# Altium footprint library UP-ROBOT Devices(2013-02-26).PcbLib: 150 footprints (part 7 of 10)
Each footprint in its own frame and in the unit in brackets; x right, y up, seen from the top. Pads: shape width x height; smd on the part's side, far side on the other; paste and mask are expansions set on the pad; w line width, h text height; cw(c..) or ccw(c..) is an arc to the next point about the centre after c.
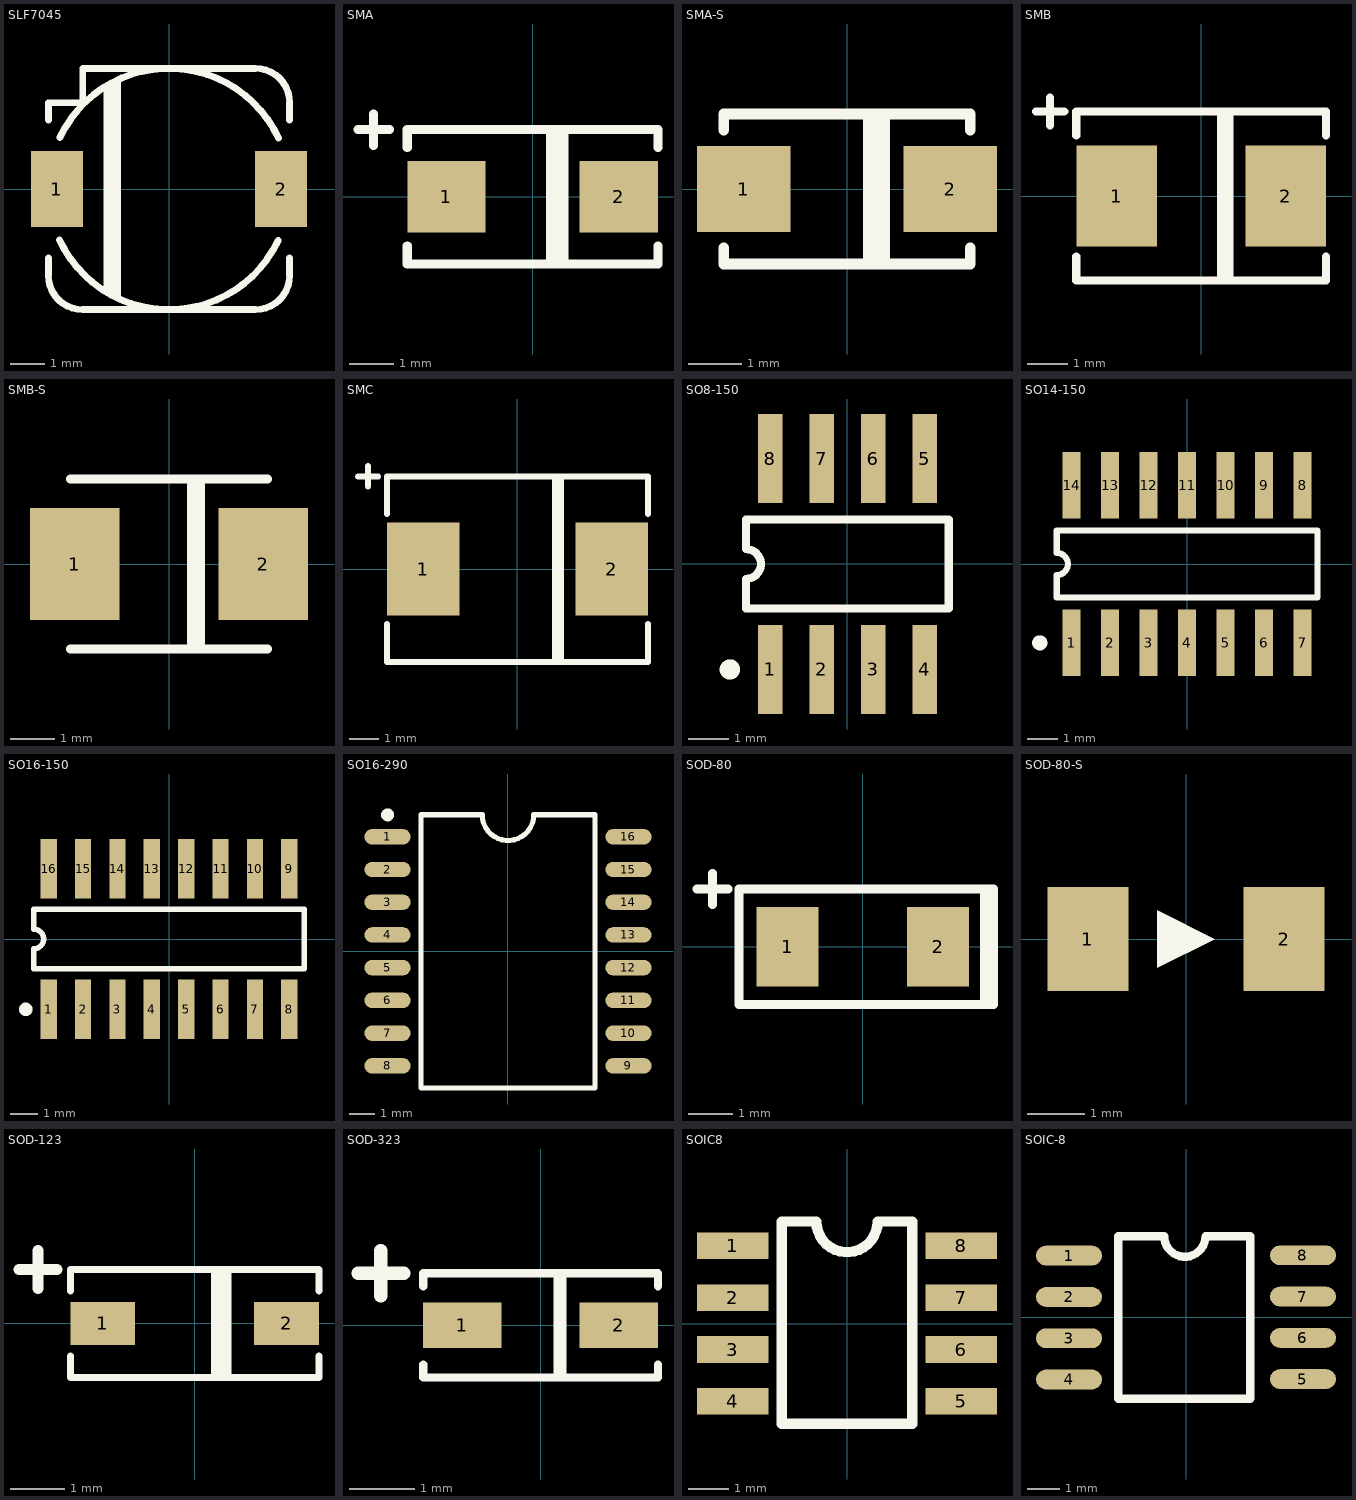
[diagram p6: the footprints below, top view; thin cyan lines are the x and y axes]

## SLF7045 [mm]
pads (2):
  rect 1.5x2.2 smd: 1(-3.25,0) 2(3.25,0)
Top Overlay:
  rectangle: -1.9,-3.03 -1.6,3.03
  rectangle: -1.69,-3.13 -1.39,3.13
  lines w0.2: -3.5,-2 -3.5,-2.5 ccw(c-2.5,-2.5) -2.5,-3.5 2.5,-3.5 ccw(c2.5,-2.5) 3.5,-2.5 3.5,-2 ; -3.5,2 -3.5,2.5 -2.5,2.5 -2.5,3.5 2.5,3.5 cw(c2.5,2.5) 3.5,2.5 3.5,2 ; -3.171,-1.482 ccw(c0,0) 3.167,-1.489 ; -3.167,1.489 cw(c0,0) 3.171,1.482
3D body: height 4.5, standoff 0, extent -3.6,-3.5 3.6,3.5

## SMA [mm]
pads (2):
  rect 1.75x1.6 smd: 1(-1.925,0) 2(1.925,0)
Top Overlay:
  rectangle: 0.3,-1.5 0.806,1.5
  lines w0.203: -3.9,1.5 -3.55,1.5 ; -3.55,1.15 -3.55,1.5 ; -3.55,1.85 -3.55,1.5 ; -3.2,1.5 -3.55,1.5 ; -2.8,-1.1 -2.8,-1.5 2.8,-1.5 2.8,-1.1 ; -2.8,1.1 -2.8,1.5 2.8,1.5 2.8,1.1

## SMA-S [mm]
pads (2):
  rect 1.75x1.6 smd: 1(-1.925,0) 2(1.925,0)
Top Overlay:
  rectangle: 0.3,-1.5 0.806,1.5
  lines w0.203: -2.3,-1.1 -2.3,-1.4 2.3,-1.4 2.3,-1.1 ; -2.3,1.1 -2.3,1.4 2.3,1.4 2.3,1.1
3D body: height 2.15, standoff 0, extent -2.6,-1.325 2.6,1.325

## SMB [mm]
pads (2):
  rect 2x2.5 smd: 1(-2.1,0) 2(2.1,0)
Top Overlay:
  rectangle: 0.4,-2.1 0.806,2.1
  lines w0.203: -4.1,2.1 -3.75,2.1 ; -3.75,1.75 -3.75,2.1 ; -3.75,2.45 -3.75,2.1 ; -3.4,2.1 -3.75,2.1 ; -3.1,-1.5 -3.1,-2.1 3.1,-2.1 3.1,-1.5 ; -3.1,1.5 -3.1,2.1 3.1,2.1 3.1,1.5
3D body: height 2.4, standoff 0, extent -2.794,-1.905 2.806,1.895

## SMB-S [mm]
pads (2):
  rect 2x2.5 smd: 1(-2.1,0) 2(2.1,0)
Top Overlay:
  rectangle: 0.4,-1.9 0.806,1.9
  lines w0.203: -2.2,-1.9 2.2,-1.9 ; -2.2,1.9 2.2,1.9
3D body: height 2.4, standoff 0, extent -2.794,-1.905 2.806,1.895

## SMC [mm]
pads (2):
  rect 2.5x3.2 smd: 1(-3.25,0) 2(3.25,0)
Top Overlay:
  rectangle: 1.2,-3.2 1.606,3.2
  lines w0.203: -5.5,3.2 -5.15,3.2 ; -5.15,2.85 -5.15,3.2 ; -5.15,3.55 -5.15,3.2 ; -4.8,3.2 -5.15,3.2 ; -4.5,-1.9 -4.5,-3.2 4.5,-3.2 4.5,-1.9 ; -4.5,1.9 -4.5,3.2 4.5,3.2 4.5,1.9
3D body: height 2.8, standoff 0, extent -3.799,-3.1 3.799,3.12

## SO8-150 [mm]
pads (8):
  rect 0.6x2.2 smd: 1(-1.905,-2.6) 2(-0.635,-2.6) 3(0.635,-2.6) 4(1.905,-2.6) 5(1.905,2.6) 6(0.635,2.6) 7(-0.635,2.6) 8(-1.905,2.6)
Top Overlay:
  circle w0.25: c-2.9,-2.6 r0.125
  lines w0.2: -2.5,-1.1 -2.5,-0.367 ccw(c-2.5,0) -2.5,0.367 -2.5,1.1 2.5,1.1 2.5,-1.1 -2.5,-1.1
3D body: height 1.4, standoff -0.05, extent -2.438,-2.972 2.464,2.972

## SO14-150 [mm]
pads (14):
  rect 0.6x2.2 smd: 1(-3.81,-2.6) 2(-2.54,-2.6) 3(-1.27,-2.6) 4(0,-2.6) 5(1.27,-2.6) 6(2.54,-2.6) 7(3.81,-2.6) 8(3.81,2.6) 9(2.54,2.6) 10(1.27,2.6) 11(0,2.6) 12(-1.27,2.6) 13(-2.54,2.6) 14(-3.81,2.6)
Top Overlay:
  circle w0.25: c-4.86,-2.6 r0.125
  lines w0.2: -4.3,-1.1 -4.3,-0.367 ccw(c-4.3,0) -4.3,0.367 -4.3,1.1 4.3,1.1 4.3,-1.1 -4.3,-1.1
3D body: height 1.75, standoff -0.01, extent -4.318,-3.048 4.318,3.048

## SO16-150 [mm]
pads (16):
  rect 0.6x2.2 smd: 1(-4.445,-2.6) 2(-3.175,-2.6) 3(-1.905,-2.6) 4(-0.635,-2.6) 5(0.635,-2.6) 6(1.905,-2.6) 7(3.175,-2.6) 8(4.445,-2.6) 9(4.445,2.6) 10(3.175,2.6) 11(1.905,2.6) 12(0.635,2.6) 13(-0.635,2.6) 14(-1.905,2.6) 15(-3.175,2.6) 16(-4.445,2.6)
Top Overlay:
  circle w0.25: c-5.295,-2.6 r0.125
  lines w0.2: -5,-1.1 -5,-0.367 ccw(c-5,0) -5,0.367 -5,1.1 5,1.1 5,-1.1 -5,-1.1
3D body: height 1.4, standoff -0.05, extent -4.978,-2.972 4.997,2.972

## SO16-290 [mm] "SOIC, 16-Leads, Body 10.6x7.7mm (max), Pitch 1.27mm, IPC Medium Density"
height 3.632
pads (16):
  oval 1.8x0.6 smd: 1(-4.675,4.445) 2(-4.675,3.175) 3(-4.675,1.905) 4(-4.675,0.635) 5(-4.675,-0.635) 6(-4.675,-1.905) 7(-4.675,-3.175) 8(-4.675,-4.445) 9(4.675,-4.445) 10(4.675,-3.175) 11(4.675,-1.905) 12(4.675,-0.635) 13(4.675,0.635) 14(4.675,1.905) 15(4.675,3.175) 16(4.675,4.445)
Top Overlay:
  circle w0.25: c-4.675,5.295 r0.125
  lines w0.2: -3.375,-5.3 3.375,-5.3 3.375,5.3 1,5.3 cw(c0,5.3) -1,5.3 -3.375,5.3 -3.375,-5.3
3D body: height 3.71, standoff 0.02, extent -5.2,-5.156 5.163,5.156

## SOD-80 [mm]
height 3.6
pads (2):
  rect 1.4x1.8 smd: 1(-1.7,0) 2(1.7,0)
Top Overlay:
  rectangle: 2.65,-1.2 3.031,1.25
  lines w0.203: -3.75,1.3 -3.4,1.3 ; -3.4,0.95 -3.4,1.3 ; -3.4,1.65 -3.4,1.3 ; -3.05,1.3 -3.4,1.3 ; -2.8,-1.3 2.95,-1.3 2.95,1.3 -2.8,1.3 -2.8,-1.3
3D body: height 1.6, standoff 0, extent -1.85,-0.787 1.85,0.813

## SOD-80-S [mm]
height 3.6
pads (2):
  rect 1.4x1.8 smd: 1(-1.7,0) 2(1.7,0)
Top Overlay:
  region: -0.5,0.5 -0.5,-0.5 0.5,0
3D body: height 1.6, standoff 0, extent -1.85,-0.787 1.85,0.813

## SOD-123 [mm]
pads (2):
  rect 1.2x0.8 smd: 1(-1.7,0) 2(1.7,0)
Top Overlay:
  rectangle: 0.3,-1 0.681,1
  lines w0.127: -2.3,-0.6 -2.3,-1 2.3,-1 2.3,-0.6 ; -2.3,0.6 -2.3,1 2.3,1 2.3,0.6
  lines w0.203: -3.25,1 -2.9,1 ; -2.9,0.65 -2.9,1 ; -2.9,1.35 -2.9,1 ; -2.55,1 -2.9,1

## SOD-323 [mm]
pads (2):
  rect 1.2x0.7 smd: 1(-1.2,0) 2(1.2,0)
Top Overlay:
  rectangle: 0.2,-0.8 0.4,0.8
  lines w0.127: -1.8,-0.6 -1.8,-0.8 1.8,-0.8 1.8,-0.6 ; -1.8,0.6 -1.8,0.8 1.8,0.8 1.8,0.6
  lines w0.203: -2.8,0.8 -2.45,0.8 ; -2.45,0.45 -2.45,0.8 ; -2.45,1.15 -2.45,0.8 ; -2.1,0.8 -2.45,0.8

## SOIC8 [mm]
pads (8):
  rect 1.75x0.65 smd: 1(-2.8,1.905) 2(-2.8,0.635) 3(-2.8,-0.635) 4(-2.8,-1.905) 5(2.8,-1.905) 6(2.8,-0.635) 7(2.8,0.635) 8(2.8,1.905)
Top Overlay:
  lines w0.254: -1.6,-2.45 1.6,-2.45 1.6,2.5 0.75,2.5 cw(c0,2.5) -0.75,2.5 -1.6,2.5 -1.6,-2.45
3D body: height 1.75, standoff 0, extent -3.03,-2.45 2.97,2.45

## SOIC-8 [mm] "SOIC, 8-Leads, Body 5.2x5.2mm (max), Pitch 1.27mm, IPC Medium Density"
height 2
pads (8):
  oval 2.032x0.61 smd: 1(-3.6,1.9) 2(-3.6,0.63) 3(-3.6,-0.64) 4(-3.6,-1.91) 5(3.6,-1.9) 6(3.6,-0.63) 7(3.6,0.64) 8(3.6,1.91)
Top Overlay:
  lines w0.254: -0.7,2.5 -2.086,2.5 -2.086,-2.5 1.978,-2.5 1.978,2.5 0.6,2.5 cw(c-0.035,2.5) -0.67,2.5
3D body: height 2.15, standoff 0, extent -4.12,-2.7 4.08,2.7